# Altium footprint library swatpcblib.PcbLib: 202 footprints (part 7 of 13)
Each footprint in its own frame and in the unit in brackets; x right, y up, seen from the top. Pads: shape width x height; smd on the part's side, far side on the other; paste and mask are expansions set on the pad; w line width, h text height; cw(c..) or ccw(c..) is an arc to the next point about the centre after c.
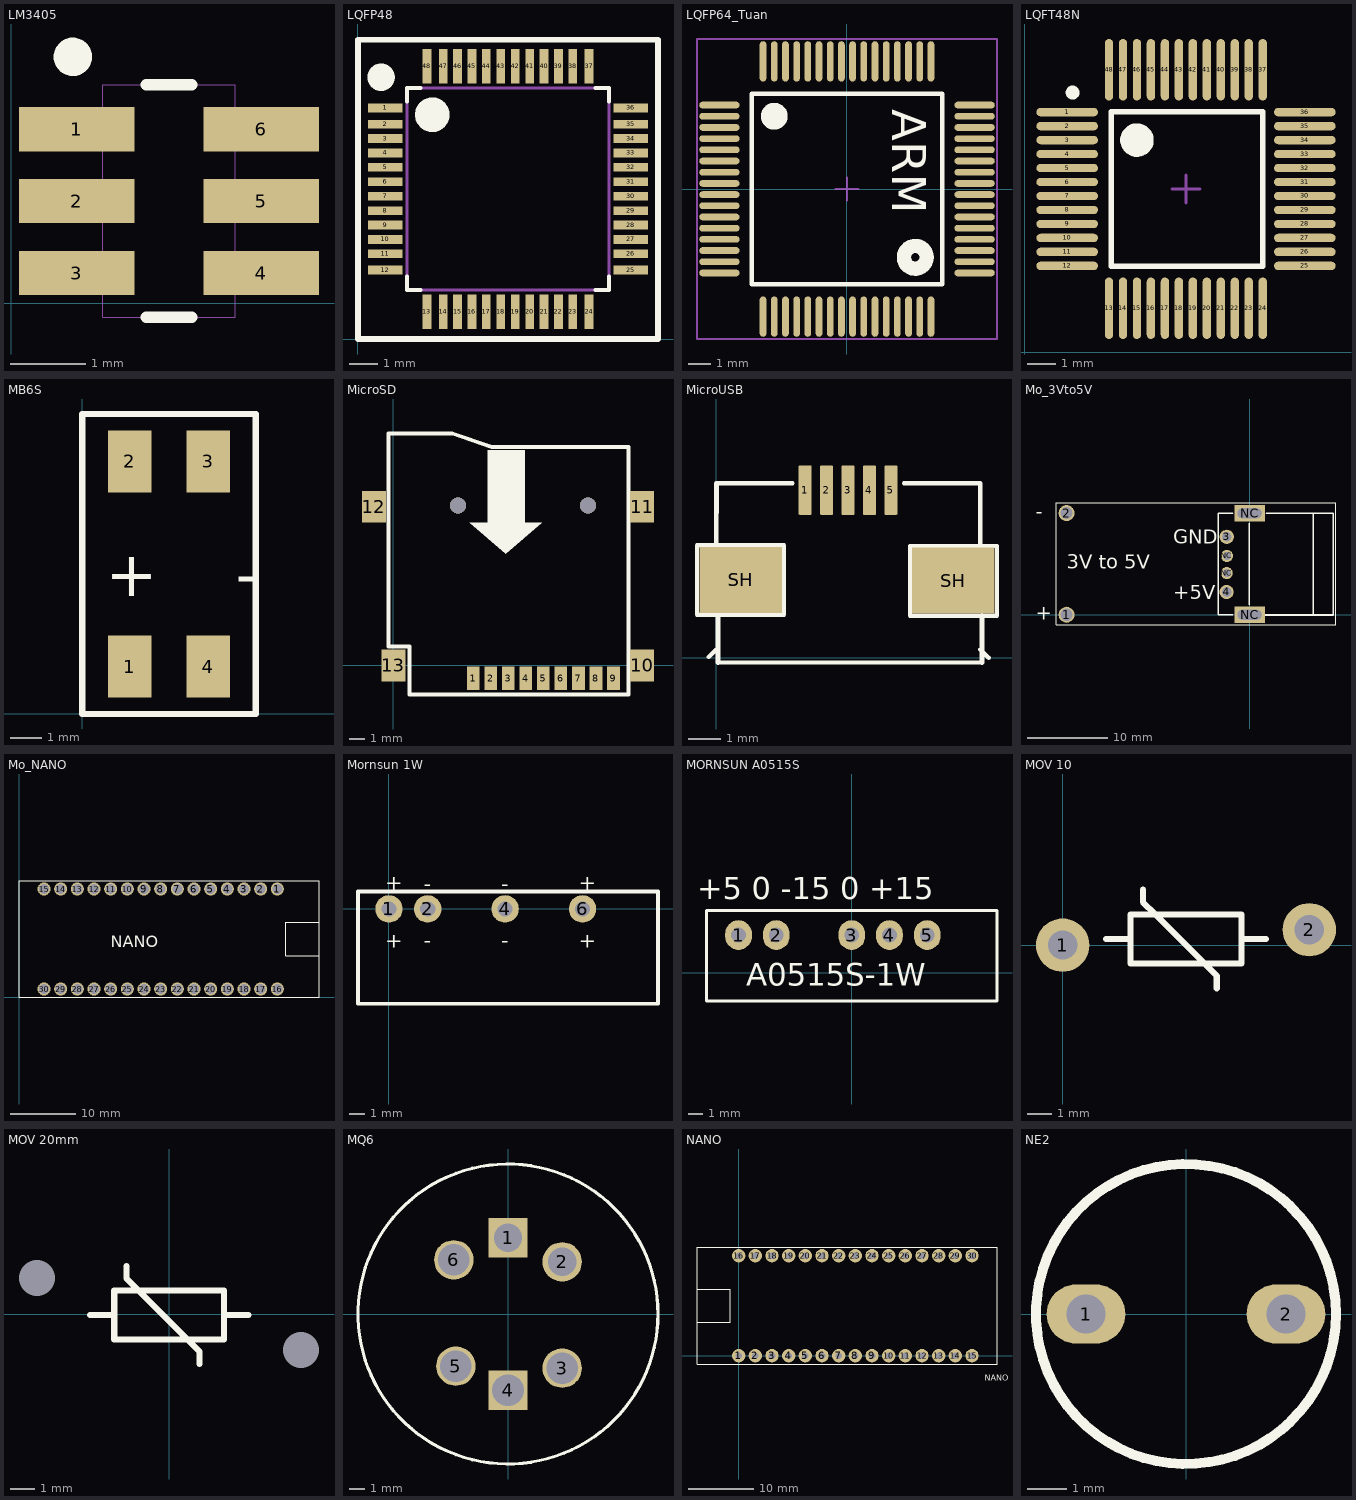
[diagram p6: the footprints below, top view; thin cyan lines are the x and y axes]

## LM3405 [mil]
pads (6):
  rect 60x23 smd: 1(34,90.4) 2(34,53) 3(34,15.6) 4(130,15.6) 5(130,53) 6(130,90.4)
Top Overlay:
  circle w10: c32,128 r5
  lines w6: 70.09,-7.5 93.91,-7.5 ; 70.09,113.5 93.91,113.5
Mechanical 1:
  lines w0: 26,6.1 47.5,6.1 47.5,25.1 26,25.1 26,6.1 ; 26,43.5 47.5,43.5 47.5,62.5 26,62.5 26,43.5 ; 26,80.9 47.5,80.9 47.5,99.9 26,99.9 26,80.9 ; 47.5,-7.5 47.5,113.5 116.5,113.5 116.5,-7.5 47.5,-7.5 ; 116.5,6.1 138,6.1 138,25.1 116.5,25.1 116.5,6.1 ; 116.5,43.5 138,43.5 138,62.5 116.5,62.5 116.5,43.5 ; 116.5,80.9 138,80.9 138,99.9 116.5,99.9 116.5,80.9
3D body "DDC0006A.stp": height 34.78, standoff -1.44, extent 25.55,-5.47 138.47,111.46

## LQFP48 [mm]
pads (48):
  rect 1.2x0.3 smd paste+0 mask+0.07: 1(0.957,8.017) 2(0.957,7.457) 3(0.957,6.957) 4(0.957,6.457) 5(0.957,5.957) 6(0.957,5.457) 7(0.957,4.957) 8(0.957,4.457) 9(0.957,3.957) 10(0.957,3.457) 11(0.957,2.957) 12(0.957,2.397) 25(9.457,2.397) 26(9.457,2.957) 27(9.457,3.457) 28(9.457,3.957) 29(9.457,4.457) 30(9.457,4.957) 31(9.457,5.457) 32(9.457,5.957) 33(9.457,6.457) 34(9.457,6.957) 35(9.457,7.457) 36(9.457,8.017)
  rect 0.3x1.2 smd paste+0 mask+0.07: 13(2.397,0.957) 14(2.957,0.957) 15(3.457,0.957) 16(3.957,0.957) 17(4.457,0.957) 18(4.957,0.957) 19(5.457,0.957) 20(5.957,0.957) 21(6.457,0.957) 22(6.957,0.957) 23(7.457,0.957) 24(8.017,0.957) 37(8.017,9.457) 38(7.457,9.457) 39(6.957,9.457) 40(6.457,9.457) 41(5.957,9.457) 42(5.457,9.457) 43(4.957,9.457) 44(4.457,9.457) 45(3.957,9.457) 46(3.457,9.457) 47(2.957,9.457) 48(2.397,9.457)
Top Overlay:
  circle w0.5: c0.807,9.082 r0.226
  circle w0.6: c2.582,7.782 r0.3
  lines w0.127: 1.707,2.182 1.707,1.707 2.182,1.707 ; 1.707,8.232 1.707,8.707 2.182,8.707 ; 8.232,1.707 8.707,1.707 8.707,2.182 ; 8.232,8.707 8.707,8.707 8.707,8.232
  lines w0.2: 0.007,0.007 0.007,10.382 10.407,10.382 10.407,0.007 0.007,0.007
Mechanical 13:
  circle w0.1: c2.607,7.807 r0.5
  lines w0.1: 1.707,1.707 1.707,8.707 8.707,8.707 8.707,1.707 1.707,1.707
Mechanical 15:
  lines w0.1: 0.007,0.007 0.007,10.407 10.407,10.407 10.407,0.007 0.007,0.007
3D body "LQFP48.step": height 1.5, standoff 0, extent 0.707,0.707 9.707,9.707

## LQFP64_Tuan [mm] "Thin QFP, 64-Leads, Body 10x10mm, Pitch 0.5mm, IPC Medium Density"
pads (64):
  oval 1.8x0.3 smd: 1(-5.7,3.75) 2(-5.7,3.25) 3(-5.7,2.75) 4(-5.7,2.25) 5(-5.7,1.75) 6(-5.7,1.25) 7(-5.7,0.75) 8(-5.7,0.25) 9(-5.7,-0.25) 10(-5.7,-0.75) 11(-5.7,-1.25) 12(-5.7,-1.75) 13(-5.7,-2.25) 14(-5.7,-2.75) 15(-5.7,-3.25) 16(-5.7,-3.75) 33(5.7,-3.75) 34(5.7,-3.25) 35(5.7,-2.75) 36(5.7,-2.25) 37(5.7,-1.75) 38(5.7,-1.25) 39(5.7,-0.75) 40(5.7,-0.25) 41(5.7,0.25) 42(5.7,0.75) 43(5.7,1.25) 44(5.7,1.75) 45(5.7,2.25) 46(5.7,2.75) 47(5.7,3.25) 48(5.7,3.75)
  oval 0.3x1.8 smd: 17(-3.75,-5.7) 18(-3.25,-5.7) 19(-2.75,-5.7) 20(-2.25,-5.7) 21(-1.75,-5.7) 22(-1.25,-5.7) 23(-0.75,-5.7) 24(-0.25,-5.7) 25(0.25,-5.7) 26(0.75,-5.7) 27(1.25,-5.7) 28(1.75,-5.7) 29(2.25,-5.7) 30(2.75,-5.7) 31(3.25,-5.7) 32(3.75,-5.7) 49(3.75,5.7) 50(3.25,5.7) 51(2.75,5.7) 52(2.25,5.7) 53(1.75,5.7) 54(1.25,5.7) 55(0.75,5.7) 56(0.25,5.7) 57(-0.25,5.7) 58(-0.75,5.7) 59(-1.25,5.7) 60(-1.75,5.7) 61(-2.25,5.7) 62(-2.75,5.7) 63(-3.25,5.7) 64(-3.75,5.7)
Top Overlay:
  circle w0.635: c3.049,-3.049 r0.509
  circle w0.6: c-3.25,3.25 r0.3
  lines w0.2: -4.25,-4.25 4.25,-4.25 4.25,4.25 -4.25,4.25 -4.25,-4.25
  text "ARM" at 2.032,3.556 h1.52
Mechanical 15:
  lines w0.1: -0.5,0 0.5,0 ; 0,-0.5 0,0.5 ; -6.7,-6.7 6.7,-6.7 6.7,6.7 -6.7,6.7 -6.7,-6.7
3D body "User Library-LQFP64-0_5.step": height 1.58, standoff 0.01, extent -5.886,-5.886 5.886,5.886

## LQFT48N [mm] "Thin QFP, 48-Leads, Body 7x7mm, Pitch 0.5mm"
pads (48):
  oval 2.2x0.3 smd: 1(1.525,8.59) 2(1.525,8.09) 3(1.525,7.59) 4(1.525,7.09) 5(1.525,6.59) 6(1.525,6.09) 7(1.525,5.59) 8(1.525,5.09) 9(1.525,4.59) 10(1.525,4.09) 11(1.525,3.59) 12(1.525,3.09) 25(10.025,3.09) 26(10.025,3.59) 27(10.025,4.09) 28(10.025,4.59) 29(10.025,5.09) 30(10.025,5.59) 31(10.025,6.09) 32(10.025,6.59) 33(10.025,7.09) 34(10.025,7.59) 35(10.025,8.09) 36(10.025,8.59)
  oval 0.3x2.2 smd: 13(3.021,1.575) 14(3.521,1.575) 15(4.021,1.575) 16(4.521,1.575) 17(5.021,1.575) 18(5.521,1.575) 19(6.021,1.575) 20(6.521,1.575) 21(7.021,1.575) 22(7.521,1.575) 23(8.021,1.575) 24(8.521,1.575) 37(8.521,10.105) 38(8.021,10.105) 39(7.521,10.105) 40(7.021,10.105) 41(6.521,10.105) 42(6.021,10.105) 43(5.521,10.105) 44(5.021,10.105) 45(4.521,10.105) 46(4.021,10.105) 47(3.521,10.105) 48(3.021,10.105)
Top Overlay:
  circle w0.6: c4.021,7.59 r0.3
  circle w0.25: c1.721,9.29 r0.125
  lines w0.2: 3.1,3.075 8.525,3.075 8.525,8.6 3.1,8.6 3.1,3.075
Mechanical 15:
  lines w0.1: 5.271,5.84 6.271,5.84 ; 5.771,5.34 5.771,6.34
3D body "User Library-LQFP48.step": height 1.5, standoff 0, extent 1.27,1.351 10.27,10.351

## MB6S [mm] "Surface mount diode bridge"
pads (4):
  rect 1.4x2 smd: 1(1.524,1.524) 2(1.524,8.128) 3(4.064,8.128) 4(4.064,1.524)
Top Overlay:
  lines w0.2: 0,0 0,9.652 5.588,9.652 5.588,0 0,0
  text "+    -" at 0.762,3.302 h2.5
3D body "User Library-SOP254P665X290.STEP": height 2.9, standoff 0, extent 0.319,1.483 5.269,8.169

## MicroSD [mm]
pads (13):
  rect 0.8x1.5 smd: 1(5.004,-0.804) 2(6.104,-0.804) 3(7.204,-0.804) 4(8.304,-0.804) 5(9.404,-0.804) 6(10.504,-0.804) 7(11.604,-0.804) 8(12.704,-0.804) 9(13.804,-0.804)
  rect 1.5x2 smd: 10(15.596,0) 11(15.596,9.95) 12(-1.219,9.95) 13(0,0)
via 12.192,10.027 diameter 1 hole 1
via 4.039,10.027 diameter 1 hole 1
Top Overlay:
  region: 8.23,13.481 5.918,13.481 5.918,8.909 5.944,8.934 4.775,8.934 7.061,7.004 9.296,8.934 8.23,8.934
  lines w0.254: -0.305,1.2 1.016,1.2 1.016,-1.835 14.732,-1.835 14.732,13.697 6.172,13.697 3.668,14.561 -0.305,14.561 -0.305,1.2
3D body "User Library-microsd card.step": height 1.2, standoff 0.2, extent 1.758,1.859 12.77,16.859
3D body: height 1.85, standoff 0, extent -0.305,-0.324 14.732,14.561

## MicroUSB [mm]
pads (7):
  rrect20% 0.4x1.5 smd: 1(2.694,5.074) 2(3.344,5.074) 3(3.994,5.074) 4(4.644,5.074) 5(5.294,5.074)
  rect 2.5x2 smd: SH(0.738,2.356) SH(7.19,2.331)
Top Overlay:
  lines w0.127: -0.227,0.019 0,0.246 0,0.248 ; 0.001,5.283 2.311,5.283 ; 0.051,-0.152 8.051,-0.152 ; 5.69,5.283 8.001,5.283 ; 8.002,0.248 8.256,-0.006 ; -0.584,1.295 -0.584,3.404 2.057,3.404 2.057,1.295 -0.584,1.295 ; 5.867,1.27 5.867,3.378 8.509,3.378 8.509,1.27 5.867,1.27
  lines w0.15: 0,3.429 0.001,5.283 ; 0.051,-0.152 0.051,1.295 ; 8.001,3.404 8.001,5.283 ; 8.051,-0.152 8.052,1.27
3D body "User Library-Micro USB.step": height 2.71, standoff -0.23, extent 0.004,-0.156 7.984,5.274

## Mo_3Vto5V [mm]
pads (8):
  round 2 hole 1.5: 1(-22.86,0) 2(-22.86,12.7)
  round 1.778 hole 1.2: 3(-2.845,9.728) 4(-2.87,2.845)
  round 1.5 hole 1: NC(-2.845,5.207) NC(-2.819,7.341)
  rect 3.81x2.032 hole 1.2 slot 3 at 0 deg: NC(0,0) NC(0,12.675)
Top Overlay:
  lines w0.1: -24.13,-1.27 10.795,-1.27 10.795,13.97 -24.13,13.97 -24.13,-1.27
  lines w0.203: -2.083,0 -3.912,0 -3.912,12.675 -2.083,12.675 ; -0.025,1.245 -0.025,11.43 ; 1.981,-0.025 10.312,-0.025 10.439,-0.025 10.439,0.483 ; 2.083,12.675 10.439,12.675 10.439,0.102 ; 7.95,-0.025 7.95,12.624
  text "+5V" at -9.525,1.905 h1.8
  text "GND" at -9.525,8.89 h1.8
  text "-" at -26.67,12.065 h1.8
  text "+" at -26.67,-0.635 h1.8
  text "3V to 5V" at -22.86,5.715 h1.8

## Mo_NANO [mm]
pads (30):
  round 2 hole 1.5: 1(39.37,16.51) 2(36.83,16.51) 3(34.29,16.51) 4(31.75,16.51) 5(29.21,16.51) 6(26.67,16.51) 7(24.13,16.51) 8(21.59,16.51) 9(19.05,16.51) 10(16.51,16.51) 11(13.97,16.51) 12(11.43,16.51) 13(8.89,16.51) 14(6.35,16.51) 15(3.81,16.51) 16(39.37,1.27) 17(36.83,1.27) 18(34.29,1.27) 19(31.75,1.27) 20(29.21,1.27) 21(26.67,1.27) 22(24.13,1.27) 23(21.59,1.27) 24(19.05,1.27) 25(16.51,1.27) 26(13.97,1.27) 27(11.43,1.27) 28(8.89,1.27) 29(6.35,1.27) 30(3.81,1.27)
Top Overlay:
  lines w0.1: 45.72,6.35 40.64,6.35 40.64,11.43 45.72,11.43 ; 0,0 45.72,0 45.72,17.78 0,17.78 0,0
  text "NANO" at 13.97,7.62 h1.8
3D body "arduino_nano.X_T": height 17.1, standoff -1.5, extent -0.11,-0.245 44.89,17.755

## Mornsun 1W [mm] "B0505LS-1W-1450"
pads (4):
  round 1.8 hole 1: 1(0,0) 2(2.54,0) 4(7.62,0) 6(12.7,0)
Top Overlay:
  lines w0.254: -2.032,-6.223 -2.032,1.143 17.653,1.143 17.653,-6.223 -2.032,-6.223
  text "-" at 2.286,-2.54 h1
  text "-" at 7.366,-2.54 h1
  text "-" at 2.286,1.143 h1
  text "-" at 7.366,1.143 h1
  text "+" at -0.254,-2.54 h1
  text "+" at 12.446,-2.54 h1
  text "+" at 12.446,1.27 h1
  text "+" at -0.254,1.27 h1
3D body "User Library-IB1205S-2W.step": height 10.01, standoff -2.49, extent -2.032,-6.045 17.568,0.965

## MORNSUN A0515S [mm]
pads (5):
  oval 1.8x2 hole 1: 1(-7.62,2.54) 2(-5.08,2.54) 3(0,2.54) 4(2.54,2.54) 5(5.08,2.54)
Top Overlay:
  lines w0.2: -9.779,-1.905 9.779,-1.905 9.779,4.191 -9.779,4.191 -9.779,-1.905
  text "A0515S-1W" at -7.112,-0.889 h1.52
  text "+5 0 -15 0 +15" at -10.414,4.953 h1.5
3D body "MORNSUN F0512S_1WR2.x_t": height 9.31, standoff -3.69, extent -9.75,-1.867 9.75,4.143

## MOV 10 [mm] "MOV ZOV 10mm"
pads (2):
  round 2.2 hole 1.2: 1(0,0) 2(10.16,0.635)
Top Overlay:
  lines w0.254: 1.778,0.254 2.794,0.254 ; 3.302,2.286 3.302,1.778 3.81,1.27 6.35,-1.27 6.35,-1.778 ; 7.366,0.254 8.382,0.254 ; 2.794,-0.762 2.794,1.27 7.366,1.27 7.366,-0.762 2.794,-0.762
3D body: height 0.25, standoff 0, extent 6.35,5.08 6.35,5.08
3D body "User Library-final MOV7,5.step": height 13.5, standoff -5, extent -0.379,-0.635 10.922,1.215

## MOV 20mm [mm]
pads (2):
  round 0 / inner round 0 / far side round 2.2 hole 1.5: 1(-5.5,1.5) 2(5.5,-1.5)
Top Overlay:
  lines w0.254: -3.298,-0.041 -2.282,-0.041 ; -1.774,1.991 -1.774,1.483 -1.266,0.975 1.274,-1.565 1.274,-2.073 ; 2.29,-0.041 3.306,-0.041 ; -2.282,-1.057 2.29,-1.057 2.29,0.975 -2.282,0.975 -2.282,-1.057
3D body "User Library-MOV, 130V, 20MM, 15KA, STRAIGHT LEAD, WPI VZ20E201KBSX-VBN.step": height 24.75, standoff -4, extent -10.156,-1.791 9.844,1.709

## MQ6 [mm]
pads (6):
  rect 2.5x2.5 hole 1.8: 1(0,4.826)
  round 2.5 hole 1.8: 2(3.429,3.302)
  round 2.5 hole 2: 3(3.429,-3.429) 6(-3.429,3.429)
  rect 2.5x2.5 hole 2: 4(0,-4.826)
  round 2.5 / inner round 2 / far side round 2 hole 2: 5(-3.302,-3.302)
Top Overlay:
  circle w0.2: c0,0 r9.5

## NANO [mil]
pads (30):
  round 80 hole 40: 1(0,0) 2(100,0) 3(200,0) 4(300,0) 5(400,0) 6(500,0) 7(600,0) 8(700,0) 9(800,0) 10(900,0) 11(1000,0) 12(1100,0) 13(1200,0) 14(1300,0) 15(1400,0) 16(0,600) 17(100,600) 18(200,600) 19(300,600) 20(400,600) 21(500,600) 22(600,600) 23(700,600) 24(800,600) 25(900,600) 26(1000,600) 27(1100,600) 28(1200,600) 29(1300,600) 30(1400,600)
Top Overlay:
  lines w3.94: -250,200 -50,200 -50,400 -250,400 ; -250,-50 -250,650 1550,650 1550,-50 -250,-50
  text "NANO" at 1475,-150 h35
3D body "arduino_nano.X_T": height 673.23, standoff -59.06, extent -217.33,-49.01 1554.33,659.64

## NE2 [mm]
pads (2):
  oval 2x1.5 hole 1: 1(-2.54,0) 2(2.54,0)
Top Overlay:
  circle w0.254: c0,0 r3.81
3D body "User Library-CAP_TANT_0_1.step": height 9.5, standoff -1.5, extent -2.174,-2.032 2.174,2.317